# Altium integrated library OMID_DXP_LIB93.IntLib: 684 symbols (part 5 of 5) (continued)
## HX711 module
designator 24 BIT ADC, comment HX?
hx711 24 bit adc with spi read; BY: OMID HABIBI; PR DATE: 27/3/94
footprint hx711-loadcell
pins: A+, A-, B+, B-, CLK, DATA, GNDX GND, GNDX GND, OUT, VCCX VCC5

## LCD TFT 1.8"
designator TFT LCD, comment LCD?
JD-T1800
footprint TFT ST7735 128X160 RGB
pins: 1 NC, 2 GND (power), 3 LEDK, 4 LEDA, 5 GND, 6 RESET, 7 RS, 8 SDA, 9 SCL, 10 VCC(2.8~3.4) (power), 11 VCC(2.8~3.4), 12 CS, 13 GND, 14 NC

## LCD TFT 1.8" Nokia c1-01
designator TFT LCD, comment LCD?
SPFD54124 Nokia c1-01 1.8 inch TFT LCD RGB 128X160 SPI
footprint TFT Nokia c1-01 128X160 RGB SPFD54124
pins: 1 NC, 2 RESET, 3 CS, 4 GND, 5 SDA, 6 SCK, 7 VDDI, 8 VDD, 9 GND, 10 LED-, 11 LED+, 12 NC

## LM2576 Package
designator U?
LM2576-100UF/63V-1000UF/16V-1N4007-1N5822-100UH/10A
footprint Module_LM2576
footprint Module_LM2576 - adj
pins: 1 VIN (power), 2 OUT (power), 3 GND (power)
text: LM2576(Module)

## LOAD CELL AD693
designator LC?
LOAD CELL(AD693-27R*2-10K-MULTITURN*2-620K-47K-4K7-520)
footprint LOAD CELL
pins: LOAD1 L1, LOAD2 L2, LOAD3 L3, LOAD4 L4, OUT i Out, SHILD, VCC VCC(12)
text: LOAD CELL; 350 OHM 2MV/V

## mA TO VOLTAGE
designator M?
0~20mA TO VOLTAGE CONVERTER(10UF*2-100NF*2-RCV420-BEAD*2-FUSE*1)
footprint CURENT>VOLTAGE
pins: 5V-OUT OUT, 20ma +VCC +12, 20ma -VCC -12, 20ma-G N D GND, 20mA-IN IN

## Microphone Module
designator Mic?
AUDIO MICROPHONE PERIAMPLIFIRE
footprint Mic module
pins: +5 5v (power), GND (power), OUT Audio (out)
text: Microphone

## MP1584
designator U?
footprint MODULE-mp1584
footprint MODULE-mp1584 - empty
pins: G GND (power), I VIN (power), O OUT (power)

## OLED .96 64x128
designator OL?
Oled 64x128 0.96" ssd1306 i2c blue&yellow
footprint OLED-0.96-i2c
pins: 1 vcc, 2 SCL, 3 Sda, 4 Rst, 5 Gnd
text: OLED; 64X128 0.96"

## PLAYER DF
designator PLAYER WAVE MP3, comment DF?
AUDIO PLAYER MODULE
footprint PLAYER-DF Player
pins: 1 VCC, 2 RX, 3 TX, 4 DAC_R, 5 DAC_L, 6 SPK1, 7 GND, 8 SPK2, 9 IO2, 10 GND (power), 11 IO2, 12 KEY1, 13 KEY2, 14 USB+, 15 USB-, 16 BUSY

## PLAYER WTV020M01
designator PLAYER WAVE MP3, comment PM?
AUDIO PLAYER MODULE
footprint PLAYER-WTV020-SD-16
pins: 1 RESET, 2 AUDIO-L, 3 NC, 4 PWM+, 5 PWM-, 6 NC, 7 CLK, 8 GND, 9 PO7, 10 DATA (in), 11 NC, 12 PO3, 13 PO2, 14 NC, 15 BUSY, 16 VCC

## power case
designator A?, comment power 12v 2a
footprint power 12v-2a

## SEGMENT-DRIVE
designator Sc?
SEGMENT WITH PWM 74595 100N
footprint SEGMENT-DRIVE
pins: 5V vcc (power), CLK (in), CS (in), G Gnd (power), PWM, SEG-PWR (power), SPI-IN (in), SPI-OUT OUT (out)
text: SEG DRV

## SIM800 MODULE
designator U?
SIM800 MODULE (GPRS/GSM); Manufacturer: Texas Instrument; Designer: Saeid Jorablo; Company: ControTec; Adding date: 1387/12/22; ComponentLink1Description: DataSheet; ComponentLink1URL: *; Reversion: *
footprint Model Name (Footprint not found)
footprint SIM800C+BATT
part A pins: 1 Ri, 2 Vcc, 3 TX, 6 sw-on, 7 RX, 8 GND

## SIM900 MODULE
designator U?
SIM900 MODULE (GPRS/GSM); Manufacturer: Texas Instrument; Designer: Saeid Jorablo; Company: ControTec; Adding date: 1387/12/22; ComponentLink1Description: DataSheet; ComponentLink1URL: *; Reversion: *
footprint Module_Sim900
part A pins: 1 Ri, 2 Vcc, 3 TX, 4 LIGHT, 6 sw-on, 7 RX, 8 GND
part B pins: LINE-L LINE L, LINE-R LINE R, MIC-N MIC N, MIC-P MIC P, SPK-N SPK N, SPK-P SPK P

## STEP Driver
designator STP?
footprint Steper-driver
pins: clk CLK, dir DIR, gnd, h-f ~{Half}/Full, RST Enable, vcc, vcc-pwr
text: L297 L298

## touch case
designator u?
footprint ttt

## TRANSISTOR DRIVE
designator A?
470 OM*2-75K-9013-4148*2
footprint Module transistor
pins: GND (power), IN (in), OUT (out), PWR +5 (power)

## WIFI HLK-M35
designator WIFI, comment HL?
WIFI USART; BY: OMID HABIBI; PR DATE: 27/8/94
footprint wifi-HLK-M35
pins: 1 3V3, 2 GND, 3 RST, 4 RX, 5 TX, 6 WIFI LED, 7 ES/RST, 8 GPIO2, 9 GPIO1
text: TWO VCC SHOULD ALL CONNECT TO POWER


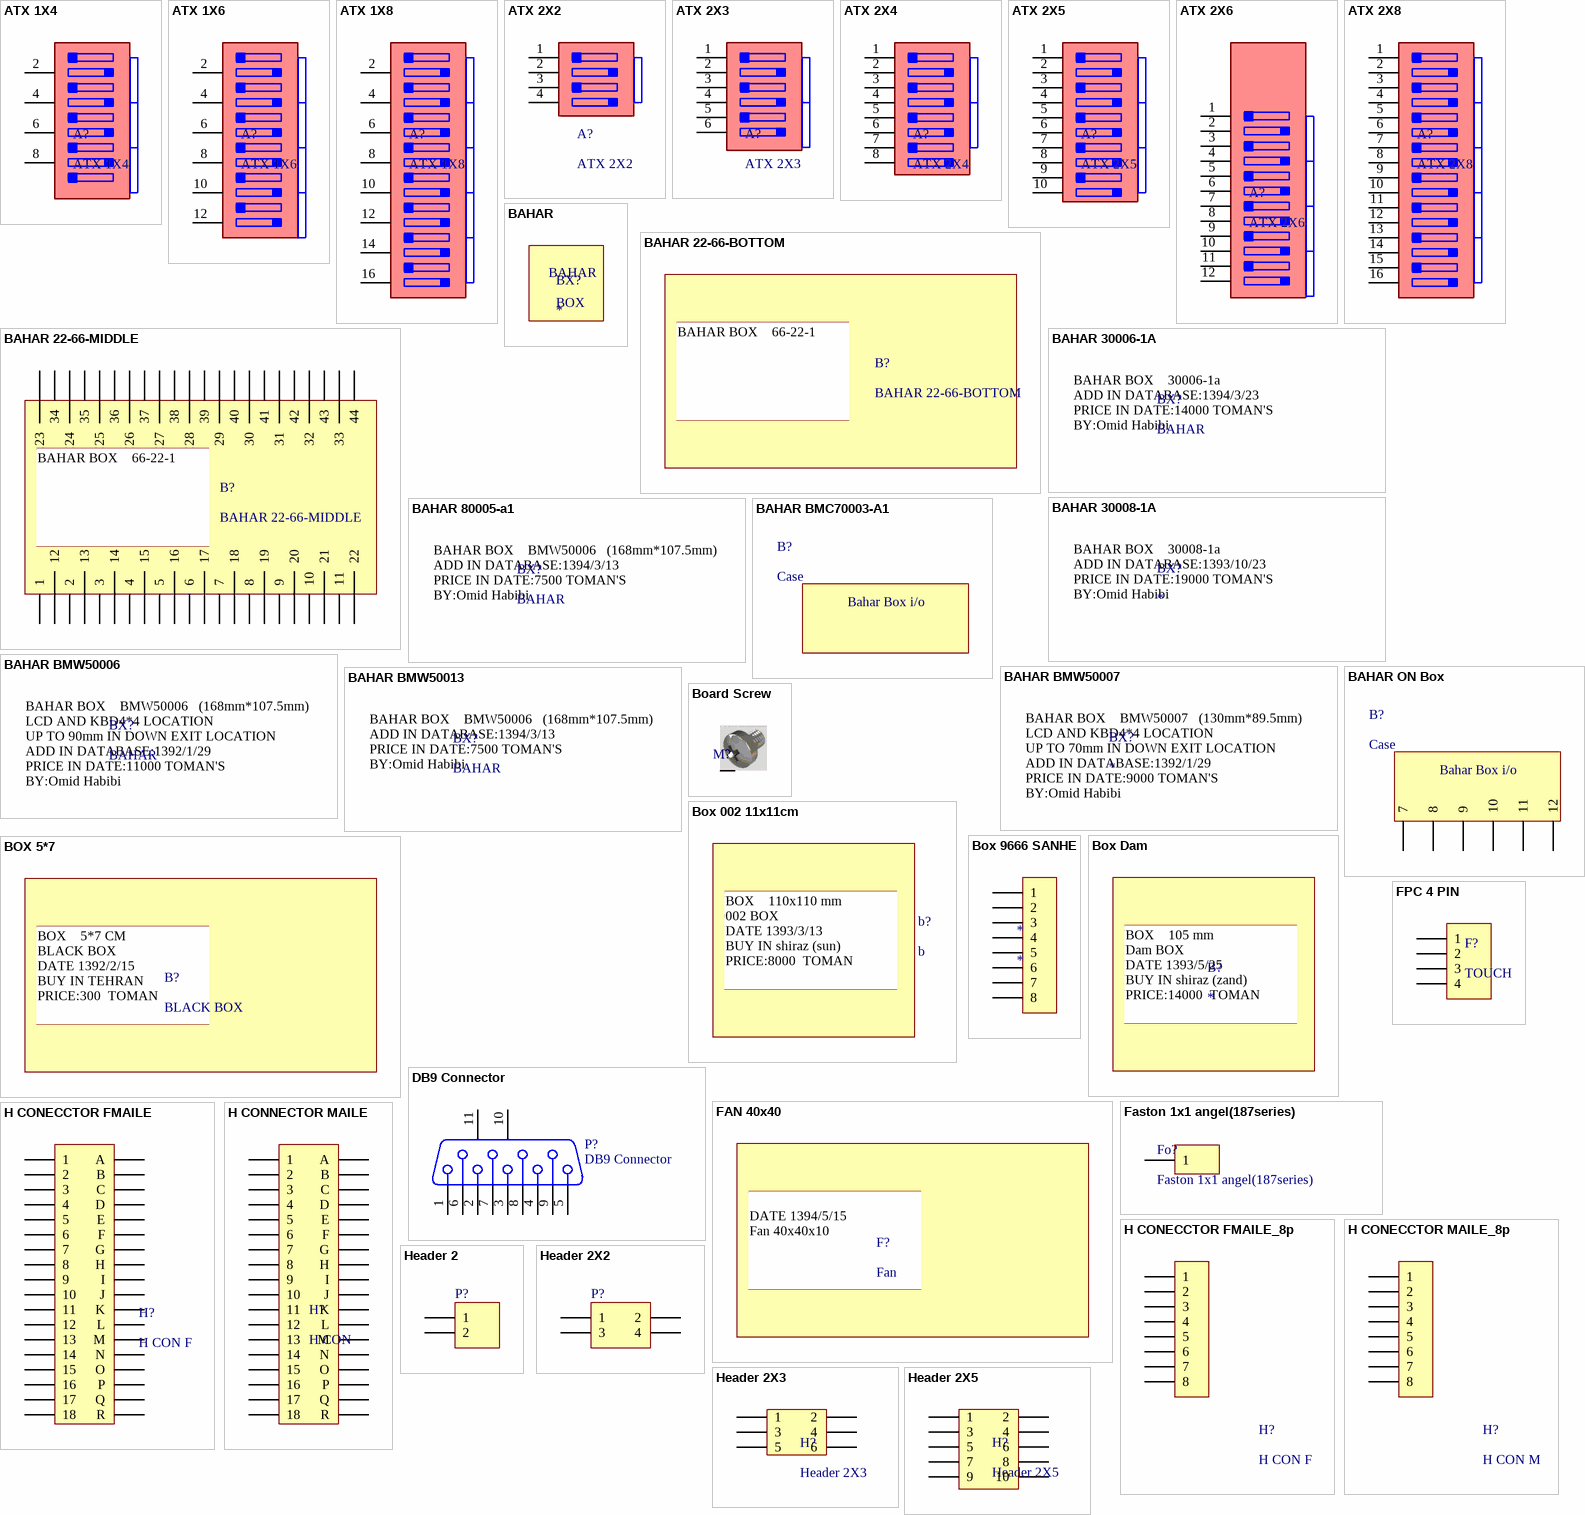
[diagram p32: symbols ATX 1X4 to Header 2X5]

## ATX 1X4
designator A?
ATX SOCKET
footprint ATX 1X4
pins: 2, 4, 6, 8

## ATX 1X6
designator A?
ATX SOCKET
footprint ATX 1X6
pins: 2, 4, 6, 8, 10, 12

## ATX 1X8
designator A?
ATX SOCKET
footprint ATX 1X8
pins: 2, 4, 6, 8, 10, 12, 14, 16

## ATX 2X2
designator A?
ATX SOCKET
footprint ATX 2X2
pins: 1, 2, 3, 4

## ATX 2X3
designator A?
ATX SOCKET
footprint ATX 2X3
pins: 1, 2, 3, 4, 5, 6

## ATX 2X4
designator A?
ATX SOCKET
footprint ATX 2X4
pins: 1, 2, 3, 4, 5, 6, 7, 8

## ATX 2X5
designator A?
ATX SOCKET
footprint ATX 2X5
pins: 1, 2, 3, 4, 5, 6, 7, 8, 9, 10

## ATX 2X6
designator A?
ATX SOCKET
footprint ATX 2X6
pins: 1, 2, 3, 4, 5, 6, 7, 8, 9, 10, 11, 12

## ATX 2X8
designator A?
ATX SOCKET
footprint ATX 2X8
pins: 1, 2, 3, 4, 5, 6, 7, 8, 9, 10, 11, 12, 13, 14, 15, 16

## BAHAR
designator BX?
footprint bahar 80003-1a-amoodi
footprint bahar 80003-1a-btn
footprint bahar 80003-1a-top
footprint BAHAR - BMD60019
footprint bahar BMW50001-A1
footprint bahar 80004-B1
footprint BAHAR - BMD30019-A2
text: BOX

## BAHAR 22-66-BOTTOM
designator B?
BAHAR BOX 22-66/1-PART3
footprint BAHAR22-66/1BOTTOM
text: BAHAR BOX    66-22-1 /

## BAHAR 22-66-MIDDLE
designator B?
BAHAR BOX 22-66/1 PART2
footprint BAHAR22-66/1MIDDLE
pins: 1, 2, 3, 4, 5, 6, 7, 8, 9, 10, 11, 12, 13, 14, 15, 16, 17, 18, 19, 20, 21, 22, 23, 24, 25, 26, 27, 28, 29, 30, 31, 32, 33, 34, 35, 36, 37, 38, 39, 40, 41, 42, 43, 44
text: BAHAR BOX    66-22-1 /

## BAHAR 30006-1A
designator BX?, comment BAHAR
BY:: OMID HABIBI; PR DATE: 27/3/94
footprint BAHAR 60003-A1 MODEM BOX
text: BAHAR BOX    30006-1a / ADD IN DATABASE:1394/3/23 / PRICE IN DATE:14000 TOMAN'S / BY:Omid Habibi /

## BAHAR 30008-1A
designator BX?
footprint bahar 80003-1a-amoodi
footprint bahar 80003-1a-btn
footprint bahar 80003-1a-top
text: BAHAR BOX    30008-1a / ADD IN DATABASE:1393/10/23 / PRICE IN DATE:19000 TOMAN'S / BY:Omid Habibi /

## BAHAR 80005-a1
designator BX?, comment BAHAR
footprint bahar 80005-a1
text: BAHAR BOX    BMW50006   (168mm*107.5mm) / ADD IN DATABASE:1394/3/13 / PRICE IN DATE:7500 TOMAN'S / BY:Omid Habibi /

## BAHAR BMC70003-A1
designator B?, comment Case
Standard On Box
footprint bahar 70003-A1
text: Bahar Box i/o

## BAHAR BMW50006
designator BX?, comment BAHAR
footprint BAHAR_BMW50006
text: BAHAR BOX    BMW50006   (168mm*107.5mm) / LCD AND KBD4*4 LOCATION / UP TO 90mm IN DOWN EXIT LOCATION / ADD IN DATABASE:1392/1/29 / PRICE IN DATE:11000 TOMAN'S / BY:Omid Habibi /

## BAHAR BMW50007
designator BX?
footprint BAHAR_BMW50007
text: BAHAR BOX    BMW50007   (130mm*89.5mm) / LCD AND KBD4*4 LOCATION / UP TO 70mm IN DOWN EXIT LOCATION / ADD IN DATABASE:1392/1/29 / PRICE IN DATE:9000 TOMAN'S / BY:Omid Habibi /

## BAHAR BMW50013
designator BX?, comment BAHAR
footprint bahar BMW500013
text: BAHAR BOX    BMW50006   (168mm*107.5mm) / ADD IN DATABASE:1394/3/13 / PRICE IN DATE:7500 TOMAN'S / BY:Omid Habibi /

## BAHAR ON Box
designator B?, comment Case
Standard On Box
footprint BAHAR_Tablo 6.5*70mm
pins: 7, 8, 9, 10, 11, 12
text: Bahar Box i/o

## Board Screw
designator M?, comment Screw  (value not drawn)
Board Screw With Spacer
footprint Board Screw
footprint Board Screw_No Silk
footprint Nut 3mm
pins: S

## Box 002 11x11cm
designator b?, comment b
footprint BOX-code:002_part1
footprint BOX-code:002_part2
text: BOX    110x110 mm / 002 BOX / DATE 1393/3/13 / BUY IN shiraz (sun) PRICE:8000  TOMAN /

## BOX 5*7
designator B?, comment BLACK BOX
BOX 5*7 BLACK
footprint BOX_5*7
text: BOX    5*7 CM / BLACK BOX / DATE 1392/2/15 / BUY IN TEHRAN PRICE:300  TOMAN /

## Box 9666 SANHE
designator *
footprint 9666 SANHE
pins: 1, 2, 3, 4, 5, 6, 7, 8

## Box Dam
designator B?
footprint Box Dam 10.5CM
text: BOX    105 mm / Dam BOX / DATE 1393/5/25 / BUY IN shiraz (zand) PRICE:14000  TOMAN /

## DB9 Connector
designator P?
Receptacle Assembly, 9 Position, Right Angle; PackageDocument: O; Positions: 9; Published: 15-Jun-2001; LatestRevisionDate: 17-Jul-2002; LatestRevisionNote: Re-released for DXP Platform.; DatasheetDocument: 1-Sep-1999; PackageReference: 788750; Publisher: Altium Limited; Orientation: Right Angle; Gender: Receptacle
signal-integrity model Connector
footprint DB9 Female (Connector; D Subminiature AMPLIMITE 2000; 9 Position; Right Angle)
footprint DB9 Male (Connector; D Subminiature AMPLIMITE 2000; 9 Position; Right Angle)
pins: 1, 2, 3, 4, 5, 6, 7, 8, 9, 10 MH1, 11 MH2

## FAN 40x40
designator F?, comment Fan
fan 40x40x10
footprint FAN 40x40
text: / DATE 1394/5/15 / Fan 40x40x10 /

## Faston 1x1 angel(187series)
designator Fo?
faston seri's 187 onboard pcb socket
footprint Faston (187 seris) TAB 4.8x0.8 x 13.5
pins: 1

## FPC 4 PIN
designator F?, comment TOUCH
footprint FPC 4 PIN
pins: 1, 2, 3, 4

## H CONECCTOR FMAILE
designator H?, comment H CON F
footprint H_CONNECTOR_FMAILE
pins: 1, 2, 3, 4, 5, 6, 7, 8, 9, 10, 11, 12, 13, 14, 15, 16, 17, 18, A, B, C, D, E, F, G, H, I, J, K, L, M, N, O, P, Q, R

## H CONECCTOR FMAILE_8p
designator H?, comment H CON F
footprint H_CONNECTOR_FMAILE_8PIN
pins: 1, 2, 3, 4, 5, 6, 7, 8

## H CONECCTOR MAILE_8p
designator H?, comment H CON M
footprint H_CONECCTOR_MAILE_8PIN
pins: 1, 2, 3, 4, 5, 6, 7, 8

## H CONNECTOR MAILE
designator H?, comment H CON
footprint H_CONECCTOR_MAILE
pins: 1, 2, 3, 4, 5, 6, 7, 8, 9, 10, 11, 12, 13, 14, 15, 16, 17, 18, A, B, C, D, E, F, G, H, I, J, K, L, M, N, O, P, Q, R

## Header 2
designator P?  (value not drawn)
PIN Header, 2-Pin; LatestRevisionDate: 17-Jul-2002; LatestRevisionNote: Re-released for DXP Platform.; Publisher: Altium Limited
footprint My_1X02
signal-integrity model Connector
pins: 1, 2

## Header 2X2
designator P?  (value not drawn)
Header, 2-Pin, Dual row; LatestRevisionDate: 17-Jul-2002; LatestRevisionNote: Re-released for DXP Platform.; Publisher: Altium Limited
footprint My_2X02
signal-integrity model Connector
pins: 1, 2, 3, 4

## Header 2X3
designator H?
footprint HEADER 3X2
pins: 1, 2, 3, 4, 5, 6

## Header 2X5
designator H?
footprint HEADER2X5
footprint Header 1.27 2x5
pins: 1, 2, 3, 4, 5, 6, 7, 8, 9, 10

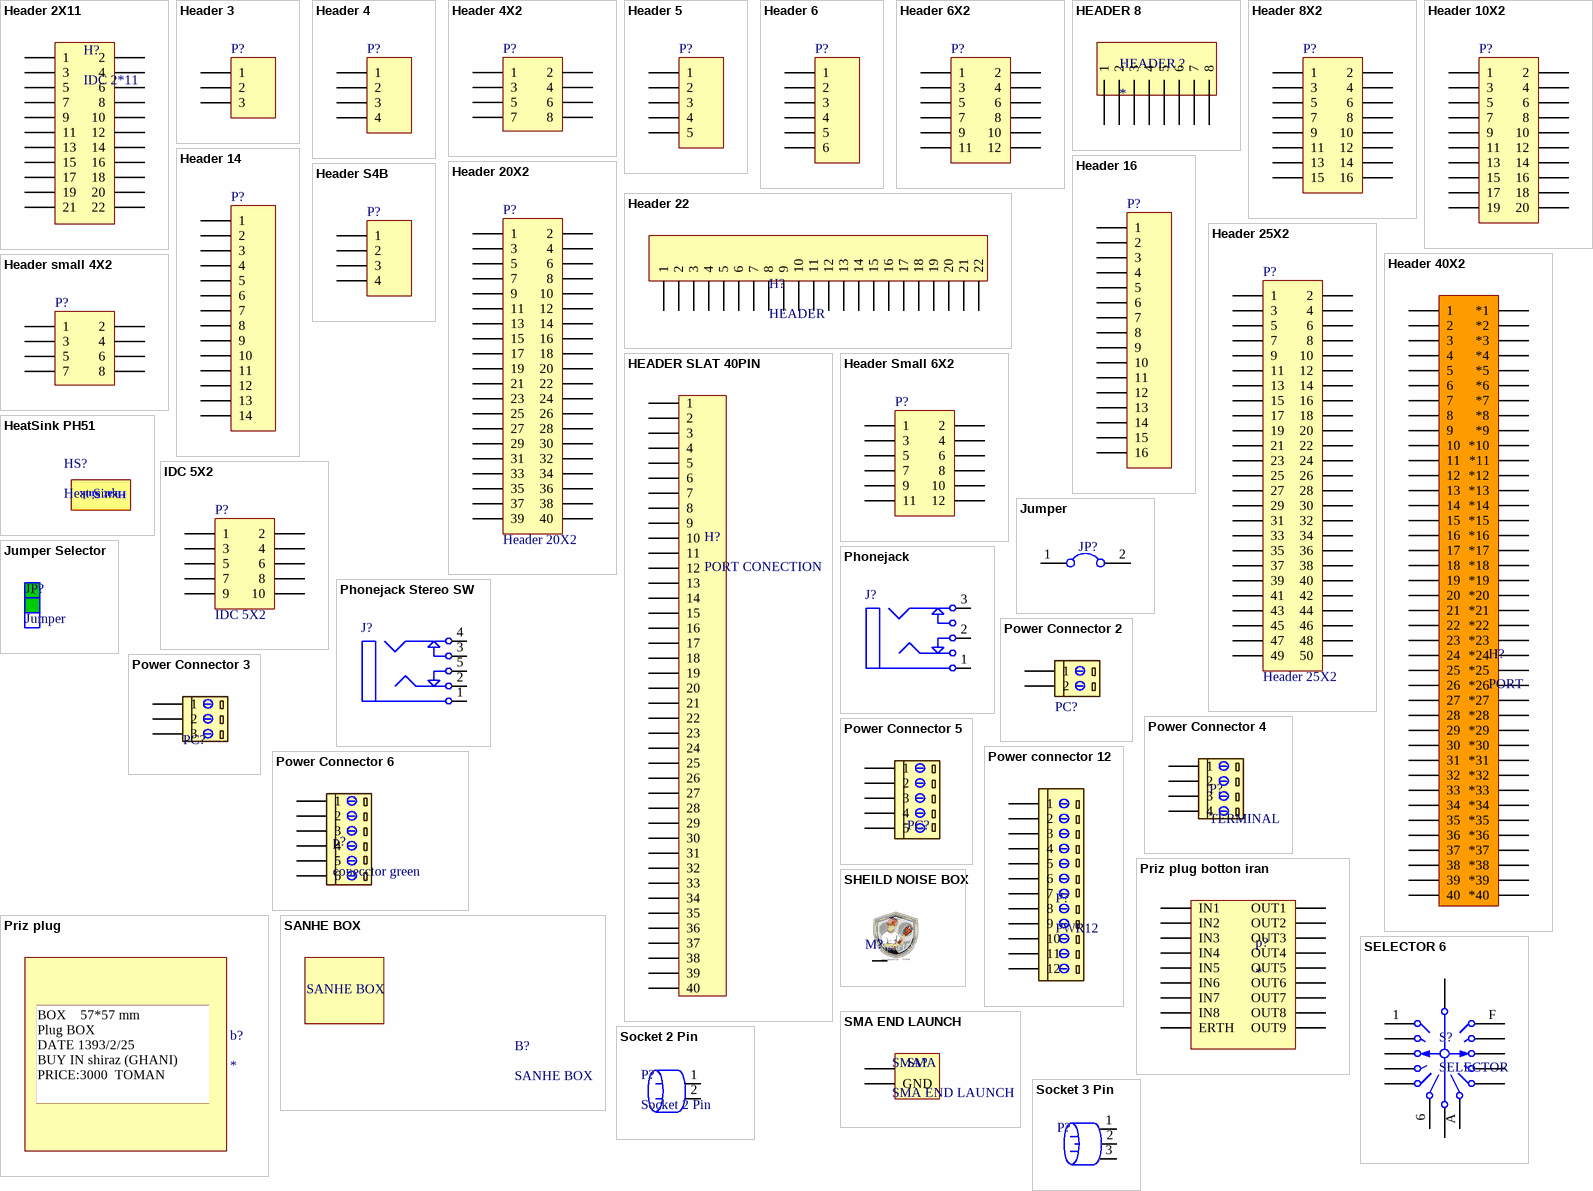
[diagram p33: symbols Header 2X11 to Socket 3 Pin]

## Header 2X11
designator H?, comment IDC 2*11
footprint MY_2X11
pins: 1, 2, 3, 4, 5, 6, 7, 8, 9, 10, 11, 12, 13, 14, 15, 16, 17, 18, 19, 20, 21, 22

## Header 3
designator P?  (value not drawn)
Header, 3-Pin; LatestRevisionDate: 17-Jul-2002; LatestRevisionNote: Re-released for DXP Platform.; Publisher: Altium Limited
footprint My_1X03
signal-integrity model Connector
footprint HEADER-3-SMD
pins: 1, 2, 3

## Header 4
designator P?  (value not drawn)
Header, 4-Pin; LatestRevisionDate: 17-Jul-2002; LatestRevisionNote: Re-released for DXP Platform.; Publisher: Altium Limited
footprint My_1X04
signal-integrity model Connector
footprint HEADER-4-SMD
pins: 1, 2, 3, 4

## Header 4X2
designator P?  (value not drawn)
Header, 6-Pin, Dual row; LatestRevisionDate: 17-Jul-2002; LatestRevisionNote: Re-released for DXP Platform.; Publisher: Altium Limited
signal-integrity model Connector
footprint MY_2X04
footprint Header 1.27 2x4
pins: 1, 2, 3, 4, 5, 6, 7, 8

## Header 5
designator P?  (value not drawn)
Header, 5-Pin; LatestRevisionDate: 17-Jul-2002; LatestRevisionNote: Re-released for DXP Platform.; Publisher: Altium Limited
footprint My_1X05
signal-integrity model Connector
footprint header-5-smd
footprint Header 1.27 1x5
pins: 1, 2, 3, 4, 5

## Header 6
designator P?  (value not drawn)
Header, 6-Pin; LatestRevisionDate: 17-Jul-2002; LatestRevisionNote: Re-released for DXP Platform.; Publisher: Altium Limited
footprint My_1X06
signal-integrity model Connector
footprint header-6-smd
pins: 1, 2, 3, 4, 5, 6

## Header 6X2
designator P?  (value not drawn)
Header, 6-Pin, Dual row; LatestRevisionDate: 17-Jul-2002; LatestRevisionNote: Re-released for DXP Platform.; Publisher: Altium Limited
footprint My_2X06
signal-integrity model Connector
pins: 1, 2, 3, 4, 5, 6, 7, 8, 9, 10, 11, 12

## HEADER 8
designator HEADER ?
footprint HEADER 8*1
pins: 1, 2, 3, 4, 5, 6, 7, 8

## Header 8X2
designator P?  (value not drawn)
Header, 8-Pin, Dual row; LatestRevisionDate: 17-Jul-2002; LatestRevisionNote: Re-released for DXP Platform.; Publisher: Altium Limited
footprint My_2X08
signal-integrity model Connector
pins: 1, 2, 3, 4, 5, 6, 7, 8, 9, 10, 11, 12, 13, 14, 15, 16

## Header 10X2
designator P?  (value not drawn)
Header, 10-Pin, Dual row; LatestRevisionDate: 17-Jul-2002; LatestRevisionNote: Re-released for DXP Platform.; Publisher: Altium Limited
footprint My_2X10
signal-integrity model Connector
pins: 1, 2, 3, 4, 5, 6, 7, 8, 9, 10, 11, 12, 13, 14, 15, 16, 17, 18, 19, 20

## Header 14
designator P?  (value not drawn)
Header, 14-Pin; LatestRevisionDate: 17-Jul-2002; LatestRevisionNote: Re-released for DXP Platform.; Publisher: Altium Limited
footprint My_1X14
signal-integrity model Connector
pins: 1, 2, 3, 4, 5, 6, 7, 8, 9, 10, 11, 12, 13, 14

## Header 16
designator P?  (value not drawn)
Header, 16-Pin; LatestRevisionDate: 17-Jul-2002; LatestRevisionNote: Re-released for DXP Platform.; Publisher: Altium Limited
footprint My_1X16
signal-integrity model Connector
pins: 1, 2, 3, 4, 5, 6, 7, 8, 9, 10, 11, 12, 13, 14, 15, 16

## Header 20X2
designator P?
Header, 20-Pin, Dual row; LatestRevisionDate: 17-Jul-2002; LatestRevisionNote: Re-released for DXP Platform.; Publisher: Altium Limited
signal-integrity model Connector
footprint My_IDCM40
footprint My_IDCM40A
footprint My_IDCRM40
footprint my_pin_40
pins: 1, 2, 3, 4, 5, 6, 7, 8, 9, 10, 11, 12, 13, 14, 15, 16, 17, 18, 19, 20, 21, 22, 23, 24, 25, 26, 27, 28, 29, 30, 31, 32, 33, 34, 35, 36, 37, 38, 39, 40

## Header 22
designator H?, comment HEADER
footprint Model Name (Footprint not found)
footprint MY_1X22
pins: 1, 2, 3, 4, 5, 6, 7, 8, 9, 10, 11, 12, 13, 14, 15, 16, 17, 18, 19, 20, 21, 22

## Header 25X2
designator P?
Header, 25-Pin, Dual row; LatestRevisionDate: 17-Jul-2002; LatestRevisionNote: Re-released for DXP Platform.; Publisher: Altium Limited
signal-integrity model Connector
footprint HEADER2X25 (Connector; Header; 25x2 Position)
pins: 1, 2, 3, 4, 5, 6, 7, 8, 9, 10, 11, 12, 13, 14, 15, 16, 17, 18, 19, 20, 21, 22, 23, 24, 25, 26, 27, 28, 29, 30, 31, 32, 33, 34, 35, 36, 37, 38, 39, 40, 41, 42, 43, 44, 45, 46, 47, 48, 49, 50

## Header 40X2
designator H?, comment PORT
HEADR DOUBLE 40 PIN
footprint HEADER 40X2 (HEADER DOUBLE 40)
pins: A1 1, A2 2, A3 3, A4 4, A5 5, A6 6, A7 7, A8 8, A9 9, A10 10, A11 11, A12 12, A13 13, A14 14, A15 15, A16 16, A17 17, A18 18, A19 19, A20 20, A21 21, A22 22, A23 23, A24 24, A25 25, A26 26, A27 27, A28 28, A29 29, A30 30, A31 31, A32 32, A33 33, A34 34, A35 35, A36 36, A37 37, A38 38, A39 39, A40 40, B1 *1, B2 *2, B3 *3, B4 *4, B5 *5, B6 *6, B7 *7, B8 *8, B9 *9, B10 *10, B11 *11, B12 *12, B13 *13, B14 *14, B15 *15, B16 *16, B17 *17, B18 *18, B19 *19, B20 *20, B21 *21, B22 *22, B23 *23, B24 *24, B25 *25, B26 *26, B27 *27, B28 *28, B29 *29, B30 *30, B31 *31, B32 *32, B33 *33, B34 *34, B35 *35, B36 *36, B37 *37, B38 *38, B39 *39, B40 *40

## Header S4B
designator P?  (value not drawn)
Header, 4-Pin slat; LatestRevisionDate: 17-Jul-2002; LatestRevisionNote: Re-released for DXP Platform.; Publisher: Altium Limited
footprint My_1X04
signal-integrity model Connector
footprint HEADER-4-SMD
footprint S4B(RIGHT)
pins: 1, 2, 3, 4

## HEADER SLAT 40PIN
designator H?, comment PORT CONECTION
HEADER MAILE 40 PIN DOUBLE
footprint HEADER SLAT CARD
pins: 1, 2, 3, 4, 5, 6, 7, 8, 9, 10, 11, 12, 13, 14, 15, 16, 17, 18, 19, 20, 21, 22, 23, 24, 25, 26, 27, 28, 29, 30, 31, 32, 33, 34, 35, 36, 37, 38, 39, 40

## Header small 4X2
designator P?  (value not drawn)
Header small , 4-Pin, Dual row; LatestRevisionDate: 17-Jul-2002; LatestRevisionNote: Re-released for DXP Platform.; Publisher: Altium Limited
signal-integrity model Connector
footprint Header_Small 2X4
pins: 1, 2, 3, 4, 5, 6, 7, 8

## Header Small 6X2
designator P?, comment Header 6X2  (value not drawn)
Header, 6-Pin, Dual row; LatestRevisionDate: 17-Jul-2002; LatestRevisionNote: Re-released for DXP Platform.; Publisher: Altium Limited
signal-integrity model Connector
footprint Header_Small 2X6
pins: 1, 2, 3, 4, 5, 6, 7, 8, 9, 10, 11, 12

## HeatSink PH51
designator HS?, comment Heat Sink  (mechanical)
PH51 Heatsink
footprint HeatSink PH51

## IDC 5X2
designator P?
Header, 5-Pin, Dual row; LatestRevisionDate: 17-Jul-2002; LatestRevisionNote: Re-released for DXP Platform.; Publisher: Altium Limited
signal-integrity model Connector
footprint IDC2.54-V10D (Connector; IDC, Low Profile Male Header, Thru-Hole; 10 Position; Vertical; Pitch 2.54 mm; Body 20.32 x 9.2 x 9.45 mm (LxWxH))
footprint IDC2.54-H10C (Connector; IDC, Low Profile Male Header, Thru-Hole; 10 Position; Right Angle; Pitch 2.54 mm; Body 20.32 x 8.9 x 9.2 mm (LxWxH))
pins: 1, 2, 3, 4, 5, 6, 7, 8, 9, 10

## Jumper
designator JP?
Jumper; Company: E.P.I.L; Defualt State: Close; Design Date: 2011/11/02
footprint Jumper
footprint Jumper SMD
footprint Jumper Small - 2.54 - BLUE
footprint Jumper Small - 2.54 - GRAY
footprint Jumper Small - 2.54 - RED
footprint Jumper Small - 2.54 - GRAY - Open
footprint Jumper SMD - Small
pins: 1, 2

## Jumper Selector
designator JP?, comment Jumper
Jumper Selector
footprint jumper selector
footprint Jumper Selector SMD
pins: 1, 2, 3

## Phonejack
designator J?
3-Conductor Jack with 2 break contacts (normals); Published: 5-Jan-2004; LatestRevisionDate: 17-Dec-2003; LatestRevisionNote: PCB Footprint replaced.; DatasheetDocument: 07-Mar-2000; Publisher: Altium Limited; ComponentLink1Description: Manufacturer Link; ComponentLink1URL: http://domino.kycon.com/internet/Products.html
footprint JACK>HEADPHONE
footprint Jack Speaker 3.5mm
pins: 1, 2, 3

## Phonejack Stereo SW
designator J?
3-Conductor Jack with 2 break contacts (normals) and 2 auxiliary make contacts; Published: 5-Jan-2004; LatestRevisionDate: 17-Dec-2003; LatestRevisionNote: PCB Footprint replaced.; DatasheetDocument: 07-Mar-2000; Publisher: Altium Limited; ComponentLink1Description: Manufacturer Link; ComponentLink1URL: http://domino.kycon.com/internet/Products.html
footprint ST-3150-5N (Connector; Stereo Jack, 3.5mm, 5 Position)
signal-integrity model Connector
pins: 1, 1A, 1B, 2, 2A, 2B, 3, 3A, 3B, 4, 4A, 4B, 5, 5A, 5B

## Power Connector 2
designator PC?  (value not drawn)
GREEN Power Connector 2PIN RIGHT ANGLE
footprint My_ Power_Connector
footprint my_power_2
footprint MY_TERMINAL2
footprint KF7620-7 .62 terminal (Terminal Block Header, 3.5mm, 4 Pos., PCB Socket)
pins: 1, 2

## Power Connector 3
designator PC?, comment PWR CONECCTOR  (value not drawn)
GREEN Power Connector 3PIN RIGHT ANGLE
footprint my_power_3
footprint KF7620-7 .62 terminal -3 (Terminal Block Header, 3.5mm, 4 Pos., PCB Socket)
pins: 1, 2, 3

## Power Connector 4
designator P?, comment TERMINAL
GREEN Power Connector 4PIN RIGHT ANGLE
footprint my_power_4
footprint POWER_CONNECTOR dOUBLE 2X2
pins: 1, 2, 3, 4

## Power Connector 5
designator PC?, comment PWR  (value not drawn)
GREEN Power Connector 5PIN RIGHT ANGLE
footprint my_power_5
pins: 1, 2, 3, 4, 5

## Power Connector 6
designator p?, comment conecctor green
GREEN Power Connector 6PIN RIGHT ANGLE
footprint MY_POWER_6
pins: 1, 2, 3, 4, 5, 6

## Power connector 12
designator P?, comment PWR12
GREEN Power Connector 12PIN RIGHT ANGLE
footprint my_power_12
pins: 1, 2, 3, 4, 5, 6, 7, 8, 9, 10, 11, 12

## Priz plug
designator b?
footprint switch Plug 220v
footprint SWITCH PLUG 220v iran
text: BOX    57*57 mm / Plug BOX / DATE 1393/2/25 / BUY IN shiraz (GHANI) PRICE:3000  TOMAN /

## Priz plug botton iran
designator p?
footprint SWITCH PLUG 220V IRAN-BOTTON
pins: ERTH, I1 IN1, I2 IN2, I3 IN3, I4 IN4, I5 IN5, I6 IN6, I7 IN7, I8 IN8, O1 OUT1, O2 OUT2, O3 OUT3, O4 OUT4, O5 OUT5, O6 OUT6, O7 OUT7, O8 OUT8, O9 OUT9

## SANHE BOX
designator B?
SANHE
footprint SANHE 20-22-2

## SELECTOR 6
designator S?, comment SELECTOR
6 CHANEL DOUBLE SELECTOR IRON
footprint selector 6 (selector felezi)
pins: 1, 2, 3, 4, 5, 6, A, B, C, com1, com2, D, E, F

## SHEILD NOISE BOX
designator M?, comment SHEILD BOX ERTH  (value not drawn)
Board Screw With Spacer; BY: OMID HABIBI; PR DATE: 27/3/94
footprint NOISE ERTH BOX
pins: 1 S

## SMA END LAUNCH
designator SMA?
footprint SMA END LAUNCH
pins: 0 GND, 1
text: SMA

## Socket 2 Pin
designator P?
Power Input
footprint 2pin
pins: 1, 2

## Socket 3 Pin
designator P?  (value not drawn)
Power Input
footprint 3PIN
pins: 1, 2, 3

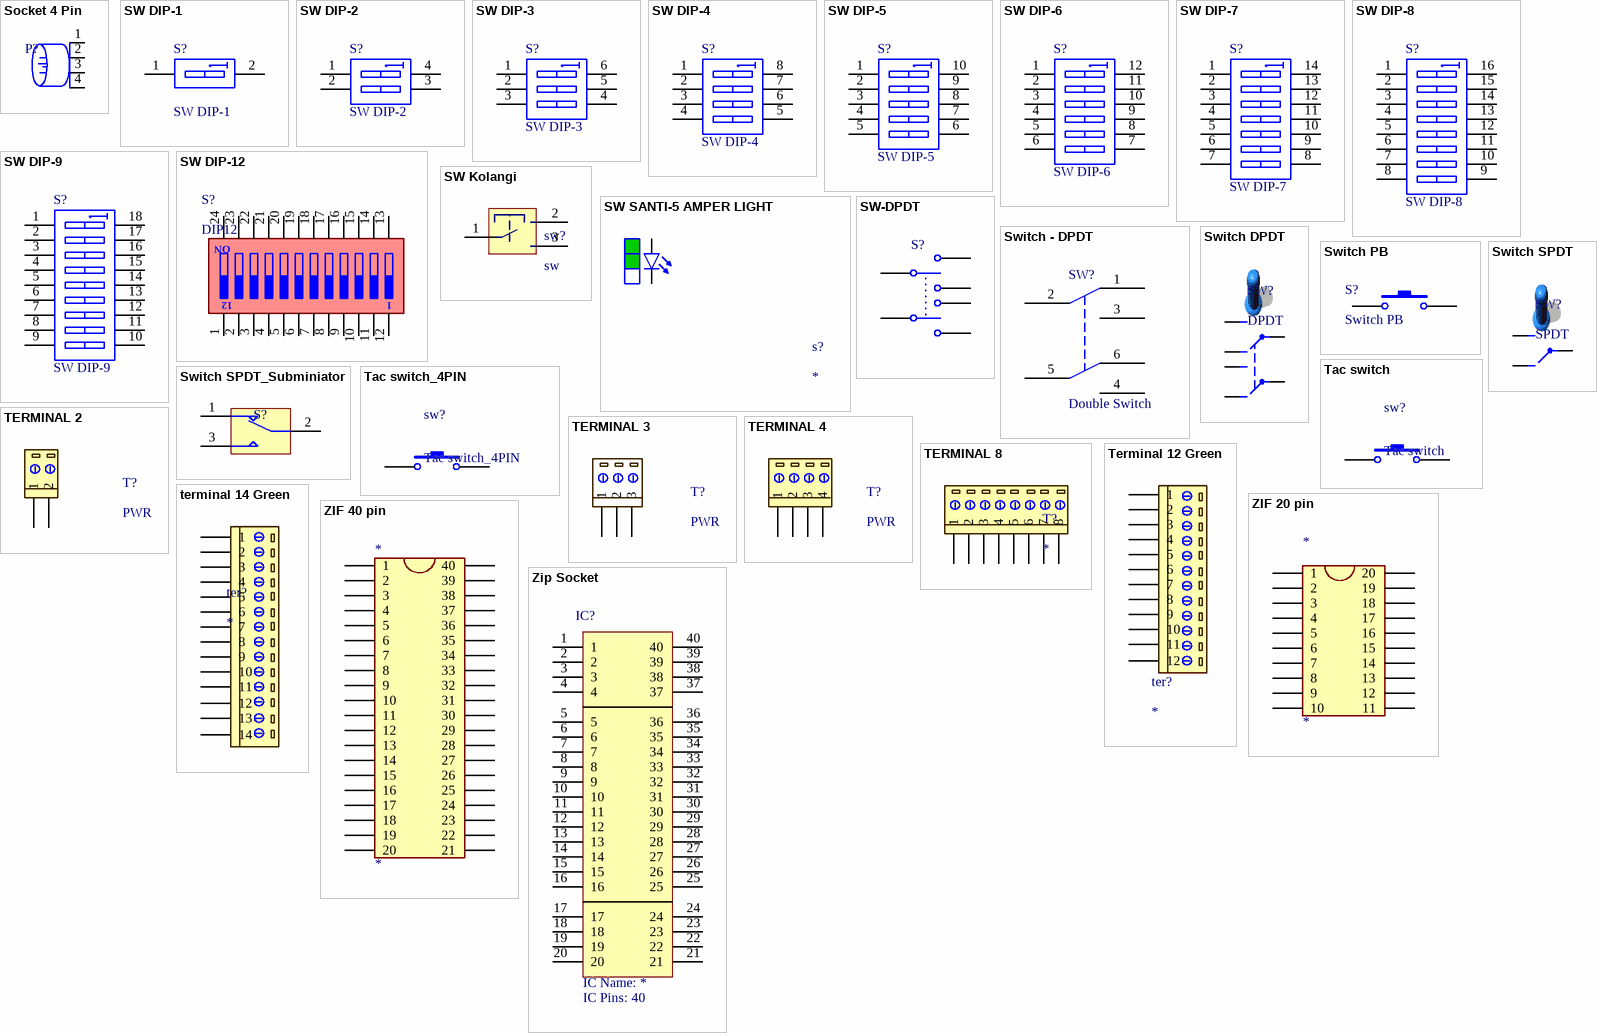
[diagram p34: symbols Socket 4 Pin to Zip Socket]

## Socket 4 Pin
designator P?  (value not drawn)
Power Input
footprint 4pin
pins: 1, 2, 3, 4

## SW DIP-1
designator S?
DIP Switch, 1Position, SPST; Published: 24-Mar-1999; LatestRevisionDate: 17-Jul-2002; LatestRevisionNote: Re-released for DXP Platform.; PackageReference: DIP-4; Publisher: Altium Limited
footprint DIP-2 (DIP; 2 Leads; Row Spacing 7.62 mm; Pitch 2.54 mm)
footprint DIP Switch x1
pins: 1 A1, 2 B1

## SW DIP-2
designator S?
DIP Switch, 2 Position, SPST; Published: 24-Mar-1999; LatestRevisionDate: 17-Jul-2002; LatestRevisionNote: Re-released for DXP Platform.; PackageReference: DIP-4; Publisher: Altium Limited
footprint DIP-4 (DIP; 4 Leads; Row Spacing 7.62 mm; Pitch 2.54 mm)
footprint DIP Switch x2
pins: 1 A1, 2 A2, 3 B2, 4 B1

## SW DIP-3
designator S?
DIP Switch, 3 Position, SPST; Published: 24-Mar-1999; LatestRevisionDate: 17-Jul-2002; LatestRevisionNote: Re-released for DXP Platform.; PackageReference: DIP-6; Publisher: Altium Limited; Code_JEDEC: MO-001-AM
footprint DIP-6 (DIP; 6 Leads; Row Spacing 7.62 mm; Pitch 2.54 mm)
footprint DIP Switch x3
pins: 1 A1, 2 A2, 3 A3, 4 B3, 5 B2, 6 B1

## SW DIP-4
designator S?
DIP Switch, 4 Position, SPST; Published: 24-Mar-1999; LatestRevisionDate: 29-May-2009; LatestRevisionNote: IPC-7351 Footprint Added.; PackageVersion: Dec-2002; PackageReference: SO8; Publisher: Altium Limited; PackageDescription: 8-Pin Small Outline Integrated Circuit 1.27 mm Pitch; Code_JEDEC: MS-012-AA; Code_IPC: SOIC127P600-8
footprint DIP-8 (DIP; 8 Leads; Row Spacing 7.62 mm; Pitch 2.54 mm)
footprint SW DIP4 - SMD
footprint DIP Switch x4
pins: 1 A1, 2 A2, 3 A3, 4 A4, 5 B4, 6 B3, 7 B2, 8 B1

## SW DIP-5
designator S?
DIP Switch, 5 Position, SPST; Published: 24-Mar-1999; LatestRevisionDate: 17-Jul-2002; LatestRevisionNote: Re-released for DXP Platform.; PackageReference: N10A; Publisher: Altium Limited
footprint DIP-10/D14.5 (DIP; 10 Leads; Row Spacing 7.62 mm; Pitch 2.54 mm)
footprint DIP Switch x5
pins: 1 A1, 2 A2, 3 A3, 4 A4, 5 A5, 6 B5, 7 B4, 8 B3, 9 B2, 10 B1

## SW DIP-6
designator S?
DIP Switch, 6 Position, SPST; Published: 24-Mar-1999; LatestRevisionDate: 17-Jul-2002; LatestRevisionNote: Re-released for DXP Platform.; PackageReference: DIP-12/SW; Publisher: Altium Limited
footprint DIP-12/SW (DIP Switch; 12 Leads)
footprint DIP Switch x6
pins: 1 A1, 2 A2, 3 A3, 4 A4, 5 A5, 6 A6, 7 B6, 8 B5, 9 B4, 10 B3, 11 B2, 12 B1

## SW DIP-7
designator S?
DIP Switch, 7 Position, SPST; Published: 24-Mar-1999; LatestRevisionDate: 17-Jul-2002; LatestRevisionNote: Re-released for DXP Platform.; PackageReference: DIP-14; Publisher: Altium Limited; Code_JEDEC: MO-001-AF
footprint DIP-14 (DIP; 14 Leads; Row Spacing 7.62 mm; Pitch 2.54 mm)
footprint DIP Switch x7
pins: 1 A1, 2 A2, 3 A3, 4 A4, 5 A5, 6 A6, 7 A7, 8 B7, 9 B6, 10 B5, 11 B4, 12 B3, 13 B2, 14 B1

## SW DIP-8
designator S?
DIP Switch, 8 Position, SPST; Published: 24-Mar-1999; LatestRevisionDate: 17-Jul-2002; LatestRevisionNote: Re-released for DXP Platform.; PackageReference: DIP_SW_8WAY_SMD; Publisher: Altium Limited
footprint DIP_SW_8WAY_SMD (DIP Switch; 16 Leads)
footprint DIP-16 (DIP; 16 Leads; Row Spacing 7.62 mm; Pitch 2.54 mm)
footprint DIP Switch x8
pins: 1 A1, 2 A2, 3 A3, 4 A4, 5 A5, 6 A6, 7 A7, 8 A8, 9 B8, 10 B7, 11 B6, 12 B5, 13 B4, 14 B3, 15 B2, 16 B1

## SW DIP-9
designator S?
DIP Switch, 9 Position, SPST; Published: 24-Mar-1999; LatestRevisionDate: 17-Jul-2002; LatestRevisionNote: Re-released for DXP Platform.; PackageReference: DIP-18; Publisher: Altium Limited; Code_JEDEC: MO-036-AE
footprint DIP-18 (DIP; 18 Leads; Row Spacing 7.62 mm; Pitch 2.54 mm)
pins: 1 A1, 2 A2, 3 A3, 4 A4, 5 A5, 6 A6, 7 A7, 8 A8, 9 A9, 10 B9, 11 B8, 12 B7, 13 B6, 14 B5, 15 B4, 16 B3, 17 B2, 18 B1

## SW DIP-12
designator S?, comment DIP12
DIP Switch, 9 Position, SPST; Designer: Saeid Jorablo; Company: ControTEK; Digits: 12 Bit; Adding Date: 1387/01/12
footprint DIP Switch x12
pins: 1, 2, 3, 4, 5, 6, 7, 8, 9, 10, 11, 12, 13, 14, 15, 16, 17, 18, 19, 20, 21, 22, 23, 24
text: ON

## SW Kolangi
designator sw?, comment sw
KOLANGI SWITCH 2ACTION
footprint my_kolangi_sw
pins: 1, 2, 3

## SW SANTI-5 AMPER LIGHT
designator s?
footprint LAY50-16AY
pins: +, -, COM, NC, NO

## SW-DPDT
designator S?
Double-Pole, Double-Throw Switch; Published: 24-Mar-1999; LatestRevisionDate: 17-Jul-2002; LatestRevisionNote: Re-released for DXP Platform.; PackageReference: DPDT-6; Publisher: Altium Limited
footprint DPDT-6 (Double-Pole, Double-Throw Switch; 6 Leads)
pins: 1, 2, 3, 4, 5, 6

## Switch - DPDT
designator SW?, comment Double Switch
DPDT Switch
footprint Switch - DPDT
pins: 1, 2, 3, 4, 5, 6

## Switch DPDT
designator SW?, comment DPDT
DPDT Switch
footprint header 3x2
pins: 1, 2, 3, 4, 5, 6

## Switch PB
designator S?
Push Button Switch
footprint Switch - Push to On
footprint SW-PB
pins: 1, 2

## Switch SPDT
designator SW?, comment SPDT
SPDT Switch; Designer: Saeid Jorablo; Company: ControTEK; Adding Date: 1387/01/10
footprint SW SPDT- Horizontal
footprint Switch SPDT - 500x270x1100x185 mil
footprint Switch SPDT - 500x270x1100x185 mil - Right Angle
pins: 1, 2, 3

## Switch SPDT_Subminiator
designator S?  (value not drawn)
Subminiator SPDT Switch; Company: E.P.I.L; Design date: 2011/11/02
footprint SPDT Subminiator (Subminiator SPDT switch)
pins: 1, 2, 3

## Tac switch
designator sw?
small tac switch 4PIN
footprint MY_TAC_SWICH_RIGHT
footprint MY_TAC_SMD
pins: 1, 2

## Tac switch_4PIN
designator sw?
small tac switch 4PIN
footprint MY_TACTILE-PTH
footprint MY_TACTILE-PTH_4X
footprint SW-PB
pins: 1, 2, 3, 4

## TERMINAL 2
designator T?, comment PWR
TERMINAL BLUE
footprint MY_TERMINAL2
pins: 1, 2

## TERMINAL 3
designator T?, comment PWR
TERMINAL BLUE
footprint MY_TERMINAL3
pins: 1, 2, 3

## TERMINAL 4
designator T?, comment PWR
TERMINAL BLUE
footprint MY_TERMINAL4
footprint ETB41*4 Green terminal Small (Terminal Block Header, 3.81mm, 4 Pos., PCB Socket)
footprint 3.5mm Green terminal Small - Right (Terminal Block Header, 3.5mm, 4 Pos., PCB Socket)
footprint 3.5mm Green terminal Small - Stand (Terminal Block Header, 3.5mm, 4 Pos., PCB Socket)
pins: 1, 2, 3, 4

## TERMINAL 8
designator T?
footprint MY_TERMINAL8
pins: 1, 2, 3, 4, 5, 6, 7, 8

## Terminal 12 Green
designator ter?
footprint my_terminal 12
pins: 1, 2, 3, 4, 5, 6, 7, 8, 9, 10, 11, 12

## terminal 14 Green
designator ter?
footprint my_terminal 14
pins: 1, 2, 3, 4, 5, 6, 7, 8, 9, 10, 11, 12, 13, 14

## ZIF 20 pin
designator *
footprint MY_ZIF20
pins: 1, 2, 3, 4, 5, 6, 7, 8, 9, 10, 11, 12, 13, 14, 15, 16, 17, 18, 19, 20

## ZIF 40 pin
designator *
footprint MY_ZIF40
pins: 1, 2, 3, 4, 5, 6, 7, 8, 9, 10, 11, 12, 13, 14, 15, 16, 17, 18, 19, 20, 21, 22, 23, 24, 25, 26, 27, 28, 29, 30, 31, 32, 33, 34, 35, 36, 37, 38, 39, 40

## Zip Socket
designator IC?  IC Pins: 40  (hidden comment: Zip Socket)
40pin Zip/Zif Socket; Company: ECI CO.; Adding Date: 11/25/2011; IC Name: *
footprint DIP40 - Zip Socket
pins: 1, 2, 3, 4, 5, 6, 7, 8, 9, 10, 11, 12, 13, 14, 15, 16, 17, 18, 19, 20, 21, 22, 23, 24, 25, 26, 27, 28, 29, 30, 31, 32, 33, 34, 35, 36, 37, 38, 39, 40


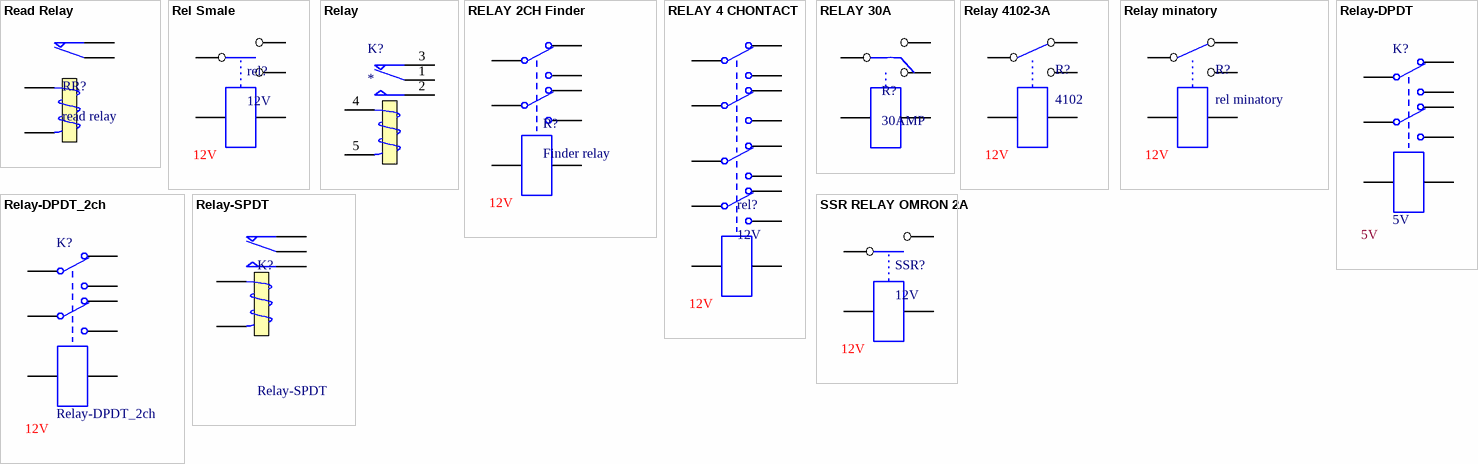
[diagram p35: symbols Read Relay to SSR RELAY OMRON 2A]

## Read Relay
designator RR?, comment read relay
READ Relay 4 Pin
footprint Read_Relay
pins: 1 T1, 2 T2, 3 COM, 4 NC

## Rel Smale
designator rel?, comment 12V
RELAY SMALL; VALUE VOLTAGE: 12V
footprint my_rel smale
footprint RELAY KHATI 5X20 MM
pins: 1, 2, 3, 4, 5

## Relay
designator K?
SPDT Relay; Designer: Eng. Saeid Jorablo; Company: E.P.I.L; Design_Date: 2011/10/31
footprint Relay 15.40x12.10x13.10
footprint Relay 18.85x15.35x15.70
footprint REL Milani compactable
pins: 1 COM, 2 NO, 3 NC, 4 T1, 5 T2

## RELAY 2CH Finder
designator R?, comment Finder relay  VOLTAGE: 12V
RELAY FINDER 2 CONTACCT
footprint relay_2contact_finder
pins: 1, 2, O1, O2, P1, P2, S1, S2

## RELAY 4 CHONTACT
designator rel?, comment 12V
4 CONTACT RELAY; VOLTAGE: 12V
footprint MY_RELAY_4CONTACT
pins: 1, 2, 3, 4, 5, 6, 7, 8, 9, 10, 11, 12, 13, 14

## RELAY 30A
designator R?, comment 30AMP
30 AMPER RELAY
footprint RELAY_30A
footprint relay_1contact_finder
pins: 1, 2, 3, 4, 5

## Relay 4102-3A
designator R?, comment 4102  VOLT: 12V
COMONICATION RELAY small 3A
footprint relay_4201
pins: 1, 3, 4, 5, 8

## Relay minatory
designator R?, comment rel minatory  VOLT: 12V
COMONICATION RELAY VERY SMALL
footprint Relay_miniatory
pins: 1, 3, 4, 5, 8

## Relay-DPDT
designator K?, comment 5V
Dual-Pole Dual-Throw Relay; Published: 24-Mar-1999; LatestRevisionDate: 17-Jul-2002; LatestRevisionNote: Re-released for DXP Platform.; PackageReference: DIP-P8; Publisher: Altium Limited; VOLTAGE: 5V
footprint My_REL_cochick
pins: 1, 2, O1, O2, P1, P2, S1, S2

## Relay-DPDT_2ch
designator K?  VOLTAGE: 12V
Dual-Pole Dual-Throw Relay DPDT; Published: 24-Mar-1999; LatestRevisionDate: 17-Jul-2002; LatestRevisionNote: Re-released for DXP Platform.; PackageReference: DIP-P8; Publisher: Altium Limited
footprint rel 2 contact
pins: 1, 2, 3, 4, 5, 6, 7, 8

## Relay-SPDT
designator K?
standard single contact relay
footprint My_rel
pins: 1 COM, 2, 3 NC, 4 T1, 5 T2

## SSR RELAY OMRON 2A
designator SSR?, comment 12V
Low cost Subminiature PCB mounting  2 amp Single in-line package (SIP) SSR; VALUE VOLTAGE: 12V
footprint SSR OMRON 2A (Low cost Subminiature PCB mounting  2 amp Single in-line package (SIP) SSR)
pins: 1, 2, 3+ +, 4- -